# Altium footprint library ProgettoAgrifoodLibreriaPCB.PcbLib: 54 footprints (part 3 of 4)
Each footprint in its own frame and in the unit in brackets; x right, y up, seen from the top. Pads: shape width x height; smd on the part's side, far side on the other; paste and mask are expansions set on the pad; w line width, h text height; cw(c..) or ccw(c..) is an arc to the next point about the centre after c.
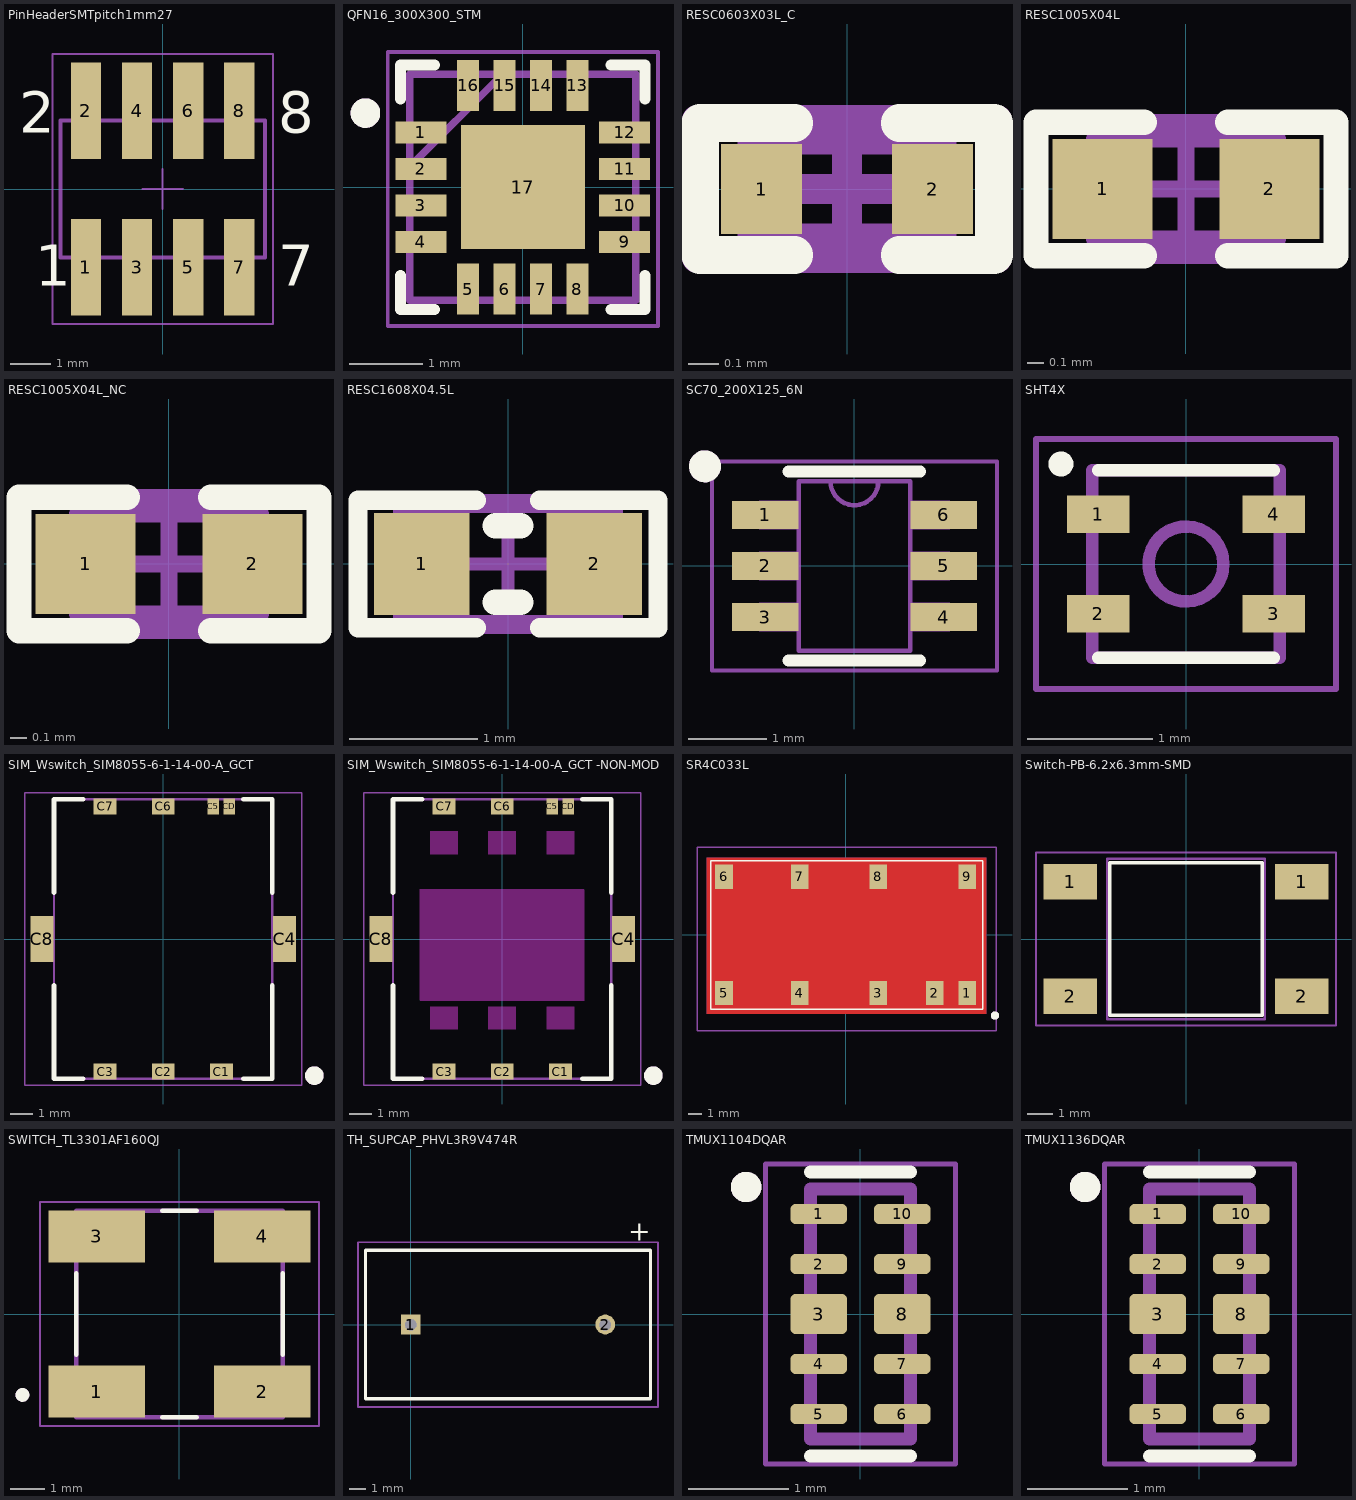
[diagram p2: the footprints below, top view; thin cyan lines are the x and y axes]

## PinHeaderSMTpitch1mm27 [mm] "Pin Header, pitch 1.27 mm, SMD, Vertical, dual row, 8p"
height 6.1
pads (8):
  rect 0.75x2.4 smd: 1(-1.905,-1.95) 2(-1.905,1.95) 3(-0.635,-1.95) 4(-0.635,1.95) 5(0.635,-1.95) 6(0.635,1.95) 7(1.905,-1.95) 8(1.905,1.95)
Top Overlay:
  text "8" at 2.87,1.4 h1.02
  text "7" at 2.87,-2.4 h1.02
  text "2" at -3.57,1.4 h1.02
  text "1" at -3.17,-2.4 h1.02
Top 3D Body:
  lines w0.1: -2.105,-1.7 -2.105,-2.5 -1.705,-2.5 -1.705,-1.7 ; -2.105,1.7 -2.105,2.5 -1.705,2.5 -1.705,1.7 ; -0.835,-1.7 -0.835,-2.5 -0.435,-2.5 -0.435,-1.7 ; -0.835,1.7 -0.835,2.5 -0.435,2.5 -0.435,1.7 ; 0.435,-1.7 0.435,-2.5 0.835,-2.5 0.835,-1.7 ; 0.435,1.7 0.435,2.5 0.835,2.5 0.835,1.7 ; 1.705,-1.7 1.705,-2.5 2.105,-2.5 2.105,-1.7 ; 1.705,1.7 1.705,2.5 2.105,2.5 2.105,1.7 ; -2.54,-1.7 2.54,-1.7 2.54,1.7 -2.54,1.7 -2.54,-1.7
Top Courtyard:
  lines w0.05: -0.5,0 0.5,0 ; 0,-0.5 0,0.5 ; -2.74,-3.35 2.74,-3.35 2.74,3.35 -2.74,3.35 -2.74,-3.35
Top Assembly:
  lines w0.1: -2.105,-1.7 -2.105,-2.5 -1.705,-2.5 -1.705,-1.7 ; -2.105,1.7 -2.105,2.5 -1.705,2.5 -1.705,1.7 ; -0.835,-1.7 -0.835,-2.5 -0.435,-2.5 -0.435,-1.7 ; -0.835,1.7 -0.835,2.5 -0.435,2.5 -0.435,1.7 ; 0.435,-1.7 0.435,-2.5 0.835,-2.5 0.835,-1.7 ; 0.435,1.7 0.435,2.5 0.835,2.5 0.835,1.7 ; 1.705,-1.7 1.705,-2.5 2.105,-2.5 2.105,-1.7 ; 1.705,1.7 1.705,2.5 2.105,2.5 2.105,1.7 ; -2.54,-1.7 -2.54,1.7 2.54,1.7 2.54,-1.7 -2.54,-1.7
  text ".Designator" at -7.498,-0.5 h1.5
3D body "62130821021.stp": height 5.9, standoff 0, extent -2.54,-2.55 2.54,2.55

## QFN16_300X300_STM [mm]
pads (17):
  rect 0.7x0.3 smd paste+0 mask+0.05: 1(-1.397,0.75) 2(-1.397,0.25) 3(-1.397,-0.25) 4(-1.397,-0.75) 9(1.397,-0.75) 10(1.397,-0.25) 11(1.397,0.25) 12(1.397,0.75)
  rect 0.3x0.7 smd paste+0 mask+0.05: 5(-0.75,-1.397) 6(-0.25,-1.397) 7(0.25,-1.397) 8(0.75,-1.397) 13(0.75,1.397) 14(0.25,1.397) 15(-0.25,1.397) 16(-0.75,1.397)
  rect 1.7x1.7 smd paste+0 mask+0.05: 17(0,0)
Top Overlay:
  circle w0.203: c-2.159,1.016 r0.102
  lines w0.152: -1.676,-1.21 -1.676,-1.676 -1.21,-1.676 ; -1.676,1.21 -1.676,1.676 -1.21,1.676 ; 1.21,-1.676 1.676,-1.676 1.676,-1.21 ; 1.21,1.676 1.676,1.676 1.676,1.21
Top Courtyard:
  lines w0.051: -1.854,-1.905 -0.979,-1.905 0.889,-1.905 1.651,-1.905 1.854,-1.905 1.854,0.979 1.854,1.854 0.979,1.854 -0.979,1.854 -1.854,1.854 -1.854,0.979 -1.854,-0.979 -1.854,-1.905
Top Assembly:
  circle w0.203: c-2.159,1.016 r0.102
  lines w0.1: -1.549,0.279 -0.279,1.549 ; -1.549,-1.549 -1.549,1.549 1.549,1.549 1.549,-1.549 -1.549,-1.549 ; -1.549,-0.902 -1.549,-0.598 -1.549,-0.902 ; -1.549,-0.402 -1.549,-0.098 -1.549,-0.402 ; -1.549,0.098 -1.549,0.402 -1.549,0.098 ; -1.549,0.598 -1.549,0.902 -1.549,0.598 ; -0.902,-1.549 -0.598,-1.549 -0.902,-1.549 ; -0.902,1.549 -0.598,1.549 -0.902,1.549 ; -0.402,-1.549 -0.098,-1.549 -0.402,-1.549 ; -0.402,1.549 -0.098,1.549 -0.402,1.549 ; 0.098,-1.549 0.402,-1.549 0.098,-1.549 ; 0.098,1.549 0.402,1.549 0.098,1.549 ; 0.598,-1.549 0.902,-1.549 0.598,-1.549 ; 0.598,1.549 0.902,1.549 0.598,1.549 ; 1.549,-0.902 1.549,-0.598 1.549,-0.902 ; 1.549,-0.402 1.549,-0.098 1.549,-0.402 ; 1.549,0.098 1.549,0.402 1.549,0.098 ; 1.549,0.598 1.549,0.902 1.549,0.598
  text ".Designator" at -1.424,-0.743 h0.9
3D body "QFN16_3X3_STM.step": height 0.99, standoff 0, extent -1.549,-1.549 1.549,1.549

## RESC0603X03L_C [mm]
pads (2):
  rect 0.27x0.3 smd: 1(-0.285,0) 2(0.285,0)
Top Overlay:
  lines w0.125: -0.175,-0.22 -0.49,-0.22 -0.49,0.22 -0.175,0.22 ; 0.175,-0.22 0.49,-0.22 0.49,0.22 0.175,0.22
Top Courtyard:
  lines w0.1: -0.165,0 0.165,0 ; 0,-0.165 0,0.165 ; -0.5,-0.23 -0.5,0.23 0.5,0.23 0.5,-0.23 -0.5,-0.23
Top Assembly:
  lines w0.1: -0.315,-0.165 0.315,-0.165 0.315,0.165 -0.315,0.165 -0.315,-0.165
  text ".Designator" at -0.306,0.268 h0.3
3D body "User Library-res0201-1.step": height 0.23, standoff 0, extent -0.3,-0.15 0.3,0.15

## RESC1005X04L [mm]
pads (2):
  rect 0.6x0.6 smd: 1(-0.5,0) 2(0.5,0)
Top Overlay:
  lines w0.152: -0.25,-0.4 -0.9,-0.4 -0.9,0.4 -0.25,0.4 ; 0.25,-0.4 0.9,-0.4 0.9,0.4 ; 0.25,0.4 0.875,0.4
Top Courtyard:
  lines w0.1: -0.275,0 0.275,0 ; 0,-0.3 0,0.3 ; -0.9,-0.4 0.9,-0.4 0.9,0.4 -0.9,0.4 -0.9,-0.4
Top Assembly:
  lines w0.1: -0.55,-0.3 -0.55,0.3 0.55,0.3 0.55,-0.3 -0.55,-0.3
  text ".Designator" at -1.27,-0.127 h0.3
3D body "User Library-res0402-1.step": height 0.3, standoff 0, extent -0.5,-0.25 0.5,0.25

## RESC1005X04L_NC [mm]
pads (2):
  rect 0.6x0.6 smd: 1(-0.5,0) 2(0.5,0)
Top Overlay:
  lines w0.152: -0.25,-0.4 -0.9,-0.4 -0.9,0.4 -0.25,0.4 ; 0.25,-0.4 0.9,-0.4 0.9,0.4 ; 0.25,0.4 0.875,0.4
Top Courtyard:
  lines w0.1: -0.275,0 0.275,0 ; 0,-0.3 0,0.3 ; -0.9,-0.4 -0.9,0.4 0.9,0.4 0.9,-0.4 -0.9,-0.4
Top Assembly:
  lines w0.1: -0.55,-0.3 0.55,-0.3 0.55,0.3 -0.55,0.3 -0.55,-0.3
  text ".Designator" at -1.27,-0.127 h0.3

## RESC1608X04.5L [mm]
pads (2):
  rect 0.75x0.8 smd: 1(-0.675,0) 2(0.675,0)
Top Overlay:
  lines w0.152: -0.25,-0.5 -1.175,-0.5 -1.175,0.5 -0.25,0.5 ; 0.25,-0.5 1.175,-0.5 1.175,0.5 0.25,0.5
  lines w0.2: -0.1,-0.3 0.1,-0.3 ; -0.1,0.3 0.1,0.3
Top Courtyard:
  lines w0.1: -0.45,0 0.45,0 ; 0,-0.45 0,0.45 ; -1.175,-0.5 1.175,-0.5 1.175,0.5 -1.175,0.5 -1.175,-0.5
Top Assembly:
  lines w0.1: -0.85,-0.45 -0.85,0.45 0.85,0.45 0.85,-0.45 -0.85,-0.45
  text ".Designator" at -0.711,-0.152 h0.3
3D body "MCT06030D1621BP500.STEP": height 0.55, standoff 0, extent -0.775,-0.425 0.775,0.425

## SC70_200X125_6N [mil]
pads (6):
  rect 33.5x14 smd paste+0 mask+2: 1(-44.75,25.59) 2(-44.75,0) 3(-44.75,-25.59) 4(44.75,-25.59) 5(44.75,0) 6(44.75,25.59)
Top Overlay:
  circle w8: c-75,50 r4
  lines w6: -33,-47.5 33,-47.5 ; -33,47.5 33,47.5
Top Courtyard:
  lines w2: -71.5,-52.5 -38,-52.5 38,-52.5 71.5,-52.5 71.5,52.5 38,52.5 -38,52.5 -71.5,52.5 -71.5,-52.5
Top Assembly:
  circle w8: c-75,50 r4
  lines w2.36: -12,42.5 ccw(c0,42.5) 12,42.5 ; -47.5,-31.59 -28,-31.59 -28,-19.59 -47.5,-19.59 -47.5,-31.59 ; -47.5,-6 -28,-6 -28,6 -47.5,6 -47.5,-6 ; -47.5,19.59 -47.5,31.59 -28,31.59 -28,19.59 -47.5,19.59 ; -28,-42.5 28,-42.5 28,42.5 -28,42.5 -28,-42.5 ; 28,-31.59 47.5,-31.59 47.5,-19.59 28,-19.59 28,-31.59 ; 28,-6 47.5,-6 47.5,6 28,6 28,-6 ; 28,19.59 47.5,19.59 47.5,31.59 28,31.59 28,19.59
3D body "DCK6_TEX.step": height 43.11, standoff 0, extent -47.52,-42.52 47.52,42.52

## SHT4X [mm]
pads (4):
  rect 0.5x0.3 smd: 1(-0.7,0.4) 2(-0.7,-0.4) 3(0.7,-0.4) 4(0.7,0.4)
Top Overlay:
  circle w0.1: c-1,0.8 r0.05
  lines w0.1: -0.7,-0.75 0.7,-0.75 ; -0.7,0.75 0.7,0.75
Top Courtyard:
  lines w0.05: -1.2,-1 1.2,-1 1.2,1 -1.2,1 -1.2,-1
Top Assembly:
  circle w0.1: c0,0 r0.3
  lines w0.1: -0.75,-0.75 0.75,-0.75 0.75,0.75 -0.75,0.75 -0.75,-0.75
  text ".Designator" at -1.297,1.129 h0.8
3D body "step_temp.STEP": height 0.54, standoff 0, extent -0.751,-0.751 0.751,0.751

## SIM_Wswitch_SIM8055-6-1-14-00-A_GCT [mm]
pads (9):
  rect 1x0.7 smd: C1(2.54,-5.795) C2(0,-5.795) C3(-2.54,-5.795) C6(0,5.795) C7(-2.54,5.795)
  rect 1x2 smd: C4(5.3,0) C8(-5.3,0)
  rect 0.5x0.7 smd mask+0.05: C5(2.19,5.795) CD(2.89,5.795)
Top Overlay:
  circle w0.406: c6.604,-5.969 r0.203
  lines w0.2: -4.77,-2.02 -4.77,-6.1 -3.5,-6.1 ; -4.77,2.02 -4.77,6.1 -3.5,6.1 ; 3.5,-6.1 4.77,-6.1 4.77,-2.02 ; 3.5,6.1 4.77,6.1 4.77,2.02
Top Courtyard:
  lines w0.076: -6.05,-6.395 6.05,-6.395 6.05,6.395 -6.05,6.395 -6.05,-6.395
Top Assembly:
  circle w0.406: c6.604,-5.969 r0.203
  lines w0.1: -4.77,-6.1 -4.77,6.1 4.77,6.1 4.77,-6.1 -4.77,-6.1
  text ".Designator" at -3.914,2.074 h1.2
3D body "SIM8055-6-1-14-00-A--3DModel-STEP-56544.STEP": height 1.35, standoff 0, extent -5.4,-6.1 5.4,6.1

## SIM_Wswitch_SIM8055-6-1-14-00-A_GCT -NON-MOD [mm]
pads (9):
  rect 1x0.7 smd: C1(2.54,-5.795) C2(0,-5.795) C3(-2.54,-5.795) C6(0,5.795) C7(-2.54,5.795)
  rect 1x2 smd: C4(5.3,0) C8(-5.3,0)
  rect 0.5x0.7 smd mask+0.05: C5(2.19,5.795) CD(2.89,5.795)
Top Overlay:
  circle w0.406: c6.604,-5.969 r0.203
  lines w0.2: -4.77,-2.02 -4.77,-6.1 -3.5,-6.1 ; -4.77,2.02 -4.77,6.1 -3.5,6.1 ; 3.5,-6.1 4.77,-6.1 4.77,-2.02 ; 3.5,6.1 4.77,6.1 4.77,2.02
Keep-Out Layer:
  region: 3.14,3.7 1.94,3.7 1.94,4.7 3.14,4.7
  region: 0.6,3.7 -0.6,3.7 -0.6,4.7 0.6,4.7
  region: -1.94,3.7 -3.14,3.7 -3.14,4.7 -1.94,4.7
  region: 0.6,-3.95 -0.6,-3.95 -0.6,-2.95 0.6,-2.95
  region: -1.94,-3.95 -3.14,-3.95 -3.14,-2.95 -1.94,-2.95
  region: 3.14,-3.95 1.94,-3.95 1.94,-2.95 3.14,-2.95
  region: 3.556,-2.679 -3.594,-2.679 -3.594,2.171 3.556,2.171
  region: 3.575,-2.7 -3.575,-2.7 -3.575,2.15 3.575,2.15
  region: 3.14,3.7 1.94,3.7 1.94,4.7 3.14,4.7
  region: 0.6,3.7 -0.6,3.7 -0.6,4.7 0.6,4.7
  region: -1.94,3.7 -3.14,3.7 -3.14,4.7 -1.94,4.7
  region: 3.14,-3.95 1.94,-3.95 1.94,-2.95 3.14,-2.95
  region: 0.6,-3.95 -0.6,-3.95 -0.6,-2.95 0.6,-2.95
  region: -1.94,-3.95 -3.14,-3.95 -3.14,-2.95 -1.94,-2.95
Top Courtyard:
  lines w0.076: -6.05,-6.395 -6.05,6.395 6.05,6.395 6.05,-6.395 -6.05,-6.395
Top Assembly:
  circle w0.406: c6.604,-5.969 r0.203
  lines w0.1: -4.77,-6.1 4.77,-6.1 4.77,6.1 -4.77,6.1 -4.77,-6.1
  text ".Designator" at -3.914,2.074 h1.2
3D body "SIM8055-6-1-14-00-A--3DModel-STEP-56544.STEP": height 1.35, standoff 0, extent -5.4,-6.1 5.4,6.1

## SR4C033L [mm]
pads (9):
  rect 1.3x1.8 smd: 1(9,-4.3) 2(6.6,-4.3) 3(2.4,-4.3) 4(-3.4,-4.3) 5(-9,-4.3) 6(-9,4.3) 7(-3.4,4.3) 8(2.4,4.3) 9(9,4.3)
Top Layer:
  pour cut-out: -10.287,5.715 10.414,5.715 10.414,-5.842 -10.287,-5.842
GND:
  pour cut-out: -10.287,5.715 10.414,5.715 10.414,-5.842 -10.287,-5.842
PWR:
  pour cut-out: -10.287,5.715 10.414,5.715 10.414,-5.842 -10.287,-5.842
Bottom Layer:
  pour cut-out: -10.287,5.715 10.414,5.715 10.414,-5.842 -10.287,-5.842
Top Overlay:
  circle w0.305: c11.049,-5.969 r0.152
  lines w0.1: -10,-5.5 10.16,-5.5 10.16,5.5 -10,5.5 -10,-5.5
Top Courtyard:
  lines w0.2: -10,-5.5 -10,5.5 10,5.5 10,-5.5 -10,-5.5
Top Assembly:
  circle w0.305: c11.049,-5.969 r0.152
  lines w0.2: -10,-5.5 -10,5.5 10,5.5 10,-5.5 -10,-5.5
  text ".Designator" at -5.087,-0.496 h1.2
Bottom Assembly:
  lines w0.1: -11,-7.1 -11,6.5 11.16,6.5 11.16,-7.1 -11,-7.1
3D body "SR4C033-L.stp": height 1.8, standoff 0, extent -10,-5.5 10,5.5

## Switch-PB-6.2x6.3mm-SMD [mm]
pads (4):
  rect 2.1x1.4 smd: 1(-4.55,2.25) 1(4.55,2.25) 2(-4.55,-2.25) 2(4.55,-2.25)
Top Overlay:
  lines w0.152: -3,-3 3,-3 3,3 -3,3 -3,-3
Top Assembly:
  lines w0.1: -3.1,-3.15 3.1,-3.15 3.1,3.15 -3.1,3.15 -3.1,-3.15
  text ".Designator" at -2.159,-0.508 h0.8
Mechanical 7:
  lines w0.09: -5.9,-3.4 -5.9,3.4 5.9,3.4 5.9,-3.4 -5.9,-3.4
3D body "c-2-1437565-9-v-3d.stp": height 4.39, standoff 0.01, extent -5,-3 5,3

## SWITCH_TL3301AF160QJ [mm]
height 5.3
pads (4):
  rect 2.8x1.5 smd: 1(-2.4,-2.25) 2(2.4,-2.25) 3(-2.4,2.25) 4(2.4,2.25)
Top Overlay:
  circle w0.2: c-4.559,-2.349 r0.1
  lines w0.127: -3,-1.18 -3,1.18 ; -0.5,-3 0.5,-3 ; -0.5,3 0.5,3 ; 3,-1.18 3,1.18
Top Courtyard:
  lines w0.05: -4.05,-3.25 4.05,-3.25 4.05,3.25 -4.05,3.25 -4.05,-3.25
Top Assembly:
  circle w0.2: c-4.559,-2.349 r0.1
  lines w0.127: -3,-3 3,-3 3,3 -3,3 -3,-3
  text ".Designator" at -2.821,-0.456 h1
3D body "TL3301AF160QJ--3DModel-STEP-613395.STEP": height 5.3, standoff 0, extent -3.3,-3 3.3,3

## TH_SUPCAP_PHVL3R9V474R [mm]
pads (2):
  rect 1.2x1.2 hole 0.7: 1(0,0)
  round 1.2 hole 0.7: 2(11.8,0)
Top Overlay:
  lines w0.2: -2.75,-4.5 -2.75,4.5 14.55,4.5 14.55,-4.5 -2.75,-4.5
  text "+" at 13.208,5.08 h1.2
Top Courtyard:
  lines w0.1: -3.2,-5 -3.2,5 15,5 15,-5 -3.2,-5
Top Assembly:
  lines w0.1: -2.75,-4.5 -2.75,4.5 14.55,4.5 14.55,-4.5 -2.75,-4.5
  text ".Designator" at 1.136,-2.595 h1
  text "-" at -0.127,1.016 h1.52
  text "+" at 10.922,1.27 h1.5
3D body "PHVL-3R9V474-R.STEP": height 13.65, standoff -26.65, extent -2.502,-4.293 14.298,4.207

## TMUX1104DQAR [mm]
pads (10):
  rrect50% 0.565x0.2 smd mask+0.05: 1(-0.417,1) 2(-0.417,0.5) 4(-0.417,-0.5) 5(-0.417,-1) 6(0.417,-1) 7(0.417,-0.5) 9(0.417,0.5) 10(0.417,1)
  rrect25% 0.565x0.4 smd paste-1 mask+0.05: 3(-0.417,0) 8(0.417,0)
Top Overlay:
  circle w0.152: c-1.143,1.27 r0.076
  lines w0.127: -0.5,-1.42 0.5,-1.42 ; -0.5,1.42 0.5,1.42
Top Paste:
  drawing of 2 lines, arcs and shapes, not listed
Top Courtyard:
  lines w0.05: -0.95,-1.5 -0.95,1.5 0.95,1.5 0.95,-1.5 -0.95,-1.5
Top Assembly:
  circle w0.152: c-1.143,1.27 r0.076
  lines w0.127: -0.5,-1.25 0.5,-1.25 0.5,1.25 -0.5,1.25 -0.5,-1.25
  text ".Designator" at 0.715,-0.515 h0.5
3D body "step_temp.STEP": height 0.55, standoff 0, extent -0.5,-1.25 0.5,1.25

## TMUX1136DQAR [mm]
pads (10):
  rrect50% 0.565x0.2 smd mask+0.05: 1(-0.417,1) 2(-0.417,0.5) 4(-0.417,-0.5) 5(-0.417,-1) 6(0.417,-1) 7(0.417,-0.5) 9(0.417,0.5) 10(0.417,1)
  rrect25% 0.565x0.4 smd paste-1 mask+0.05: 3(-0.417,0) 8(0.417,0)
Top Overlay:
  circle w0.152: c-1.143,1.27 r0.076
  lines w0.127: -0.5,-1.42 0.5,-1.42 ; -0.5,1.42 0.5,1.42
Top Paste:
  drawing of 2 lines, arcs and shapes, not listed
Top Courtyard:
  lines w0.05: -0.95,-1.5 -0.95,1.5 0.95,1.5 0.95,-1.5 -0.95,-1.5
Top Assembly:
  circle w0.152: c-1.143,1.27 r0.076
  lines w0.127: -0.5,-1.25 0.5,-1.25 0.5,1.25 -0.5,1.25 -0.5,-1.25
  text ".Designator" at 0.715,-0.515 h0.5
3D body "step_temp.STEP": height 0.55, standoff 0, extent -0.5,-1.25 0.5,1.25